# Altium schematic symbol library jlcpcb_2025_04_resistors_extended_1210.schlib: 2670 symbols (part 14 of 14)
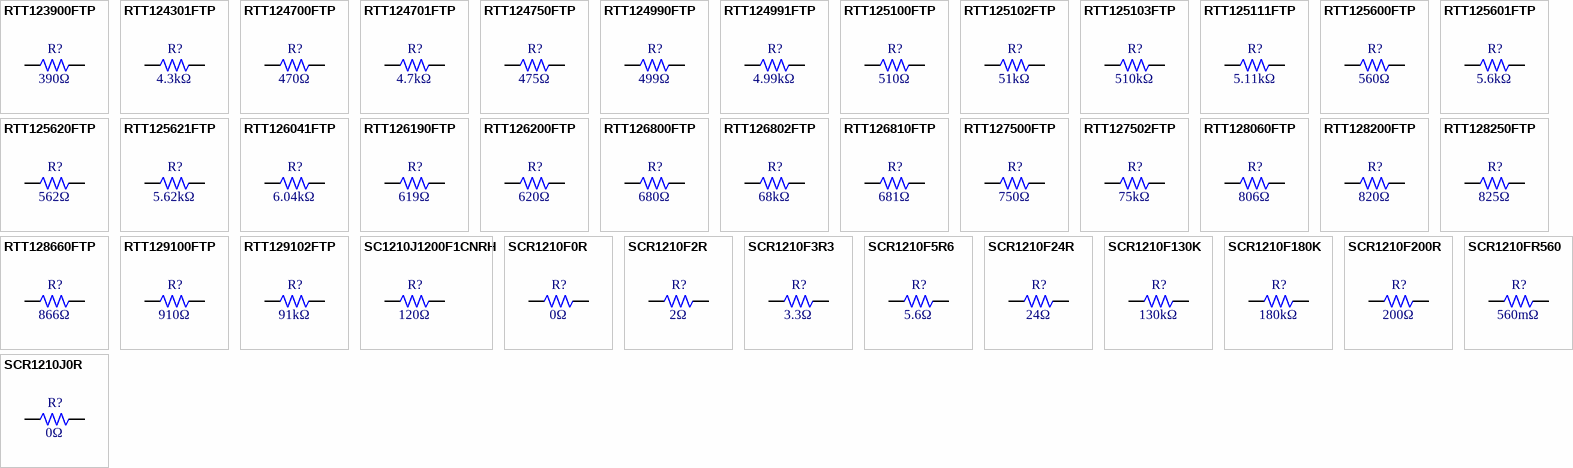
[diagram p79: symbols RTT123900FTP to SCR1210J0R]

## RTT128200FTP
designator R?  Resistance: 820Ω  (hidden comment: *)
Resistor, 820Ω, ±1%, 500mW, 200V, ±100ppm/℃, -55℃~+155℃, SMD 1210; Manufacturer: Uniroyal; Manufacturer Part Number: RTT128200FTP; Supplier 1: LCSC; Supplier Part Number 1: C333231; JLCPCB Part Number: C333231; Power Rating: 500mW; Category: Resistors; Package Size: 1210; JLCPCB Basic Part: Yes; Tolerance: ±1%; Voltage Rating: 200V; Temperature Coefficient: ±100ppm/℃; Temperature Rating: -55℃~+155℃; ComponentLink1Description: Datasheet; ComponentLink1URL: https://wmsc.lcsc.com/wmsc/upload/file/pdf/v2/lcsc/2304140030_RALEC-RTT128200FTP_C333231.pdf; ComponentLink2Description: JLCPCB Part URL; ComponentLink2URL: https://jlcpcb.com/partdetail/C333231
pins: 1, 2
1 alternate drawing of the same symbol

## RTT128250FTP
designator R?  Resistance: 825Ω  (hidden comment: *)
Resistor, 825Ω, ±1%, 500mW, 200V, ±100ppm/℃, -55℃~+155℃, SMD 1210; Manufacturer: Uniroyal; Manufacturer Part Number: RTT128250FTP; Supplier 1: LCSC; Supplier Part Number 1: C333233; JLCPCB Part Number: C333233; Power Rating: 500mW; Category: Resistors; Package Size: 1210; JLCPCB Basic Part: Yes; Tolerance: ±1%; Voltage Rating: 200V; Temperature Coefficient: ±100ppm/℃; Temperature Rating: -55℃~+155℃; ComponentLink1Description: Datasheet; ComponentLink1URL: https://wmsc.lcsc.com/wmsc/upload/file/pdf/v2/lcsc/2304140030_RALEC-RTT128250FTP_C333233.pdf; ComponentLink2Description: JLCPCB Part URL; ComponentLink2URL: https://jlcpcb.com/partdetail/C333233
pins: 1, 2
1 alternate drawing of the same symbol

## RTT128660FTP
designator R?  Resistance: 866Ω  (hidden comment: *)
Resistor, 866Ω, ±1%, 500mW, 200V, ±100ppm/℃, -55℃~+155℃, SMD 1210; Manufacturer: Uniroyal; Manufacturer Part Number: RTT128660FTP; Supplier 1: LCSC; Supplier Part Number 1: C333235; JLCPCB Part Number: C333235; Power Rating: 500mW; Category: Resistors; Package Size: 1210; JLCPCB Basic Part: Yes; Tolerance: ±1%; Voltage Rating: 200V; Temperature Coefficient: ±100ppm/℃; Temperature Rating: -55℃~+155℃; ComponentLink1Description: Datasheet; ComponentLink1URL: https://wmsc.lcsc.com/wmsc/upload/file/pdf/v2/lcsc/2304140030_RALEC-RTT128660FTP_C333235.pdf; ComponentLink2Description: JLCPCB Part URL; ComponentLink2URL: https://jlcpcb.com/partdetail/C333235
pins: 1, 2
1 alternate drawing of the same symbol

## RTT129100FTP
designator R?  Resistance: 910Ω  (hidden comment: *)
Resistor, 910Ω, ±1%, 500mW, 200V, ±100ppm/℃, -55℃~+155℃, SMD 1210; Manufacturer: Uniroyal; Manufacturer Part Number: RTT129100FTP; Supplier 1: LCSC; Supplier Part Number 1: C333238; JLCPCB Part Number: C333238; Power Rating: 500mW; Category: Resistors; Package Size: 1210; JLCPCB Basic Part: Yes; Tolerance: ±1%; Voltage Rating: 200V; Temperature Coefficient: ±100ppm/℃; Temperature Rating: -55℃~+155℃; ComponentLink1Description: Datasheet; ComponentLink1URL: https://wmsc.lcsc.com/wmsc/upload/file/pdf/v2/lcsc/2304140030_RALEC-RTT129100FTP_C333238.pdf; ComponentLink2Description: JLCPCB Part URL; ComponentLink2URL: https://jlcpcb.com/partdetail/C333238
pins: 1, 2
1 alternate drawing of the same symbol

## RTT129102FTP
designator R?  Resistance: 91kΩ  (hidden comment: *)
Resistor, 91kΩ, ±1%, 500mW, 200V, ±100ppm/℃, -55℃~+155℃, SMD 1210; Manufacturer: Uniroyal; Manufacturer Part Number: RTT129102FTP; Supplier 1: LCSC; Supplier Part Number 1: C333240; JLCPCB Part Number: C333240; Power Rating: 500mW; Category: Resistors; Package Size: 1210; JLCPCB Basic Part: Yes; Tolerance: ±1%; Voltage Rating: 200V; Temperature Coefficient: ±100ppm/℃; Temperature Rating: -55℃~+155℃; ComponentLink1Description: Datasheet; ComponentLink1URL: https://wmsc.lcsc.com/wmsc/upload/file/pdf/v2/lcsc/2304140030_RALEC-RTT129102FTP_C333240.pdf; ComponentLink2Description: JLCPCB Part URL; ComponentLink2URL: https://jlcpcb.com/partdetail/C333240
pins: 1, 2
1 alternate drawing of the same symbol

## SC1210J1200F1CNRH
designator R?  Resistance: 120Ω  (hidden comment: *)
Resistor, 120Ω, ±5%, 500mW, ±100ppm/℃, SMD 1210; Manufacturer: Uniroyal; Manufacturer Part Number: SC1210J1200F1CNRH; Supplier 1: LCSC; Supplier Part Number 1: C5140564; JLCPCB Part Number: C5140564; Power Rating: 500mW; Category: Resistors; Package Size: 1210; JLCPCB Basic Part: Yes; Tolerance: ±5%; Temperature Coefficient: ±100ppm/℃; ComponentLink1Description: Datasheet; ComponentLink1URL: https://datasheet.lcsc.com/lcsc/2208161601_Sunway-SC1210J1200F1CNRH_C5140564.pdf; ComponentLink2Description: JLCPCB Part URL; ComponentLink2URL: https://jlcpcb.com/partdetail/C5140564
pins: 1, 2
1 alternate drawing of the same symbol

## SCR1210F0R
designator R?  Resistance: 0Ω  (hidden comment: *)
Resistor, 0Ω, ±1%, SMD 1210; Manufacturer: Uniroyal; Manufacturer Part Number: SCR1210F0R; Supplier 1: LCSC; Supplier Part Number 1: C3017387; JLCPCB Part Number: C3017387; Category: Resistors; Package Size: 1210; JLCPCB Basic Part: Yes; Tolerance: ±1%; ComponentLink1Description: Datasheet; ComponentLink1URL: https://wmsc.lcsc.com/wmsc/upload/file/pdf/v2/lcsc/2206021145_VO-SCR1210F0R_C3017387.pdf; ComponentLink2Description: JLCPCB Part URL; ComponentLink2URL: https://jlcpcb.com/partdetail/C3017387
pins: 1, 2
1 alternate drawing of the same symbol

## SCR1210F2R
designator R?  Resistance: 2Ω  (hidden comment: *)
Resistor, 2Ω, ±1%, 500mW, 200V, -55℃~+155℃, SMD 1210; Manufacturer: Uniroyal; Manufacturer Part Number: SCR1210F2R; Supplier 1: LCSC; Supplier Part Number 1: C3017368; JLCPCB Part Number: C3017368; Power Rating: 500mW; Category: Resistors; Package Size: 1210; JLCPCB Basic Part: Yes; Tolerance: ±1%; Voltage Rating: 200V; Temperature Rating: -55℃~+155℃; ComponentLink1Description: Datasheet; ComponentLink1URL: https://wmsc.lcsc.com/wmsc/upload/file/pdf/v2/lcsc/2206021145_VO-SCR1210F2R_C3017368.pdf; ComponentLink2Description: JLCPCB Part URL; ComponentLink2URL: https://jlcpcb.com/partdetail/C3017368
pins: 1, 2
1 alternate drawing of the same symbol

## SCR1210F3R3
designator R?  Resistance: 3.3Ω  (hidden comment: *)
Resistor, 3.3Ω, ±1%, 500mW, 200V, -55℃~+155℃, SMD 1210; Manufacturer: Uniroyal; Manufacturer Part Number: SCR1210F3R3; Supplier 1: LCSC; Supplier Part Number 1: C3017390; JLCPCB Part Number: C3017390; Power Rating: 500mW; Category: Resistors; Package Size: 1210; JLCPCB Basic Part: Yes; Tolerance: ±1%; Voltage Rating: 200V; Temperature Rating: -55℃~+155℃; ComponentLink1Description: Datasheet; ComponentLink1URL: https://wmsc.lcsc.com/wmsc/upload/file/pdf/v2/lcsc/2206021145_VO-SCR1210F3R3_C3017390.pdf; ComponentLink2Description: JLCPCB Part URL; ComponentLink2URL: https://jlcpcb.com/partdetail/C3017390
pins: 1, 2
1 alternate drawing of the same symbol

## SCR1210F5R6
designator R?  Resistance: 5.6Ω  (hidden comment: *)
Resistor, 5.6Ω, ±1%, 500mW, 200V, -55℃~+155℃, SMD 1210; Manufacturer: Uniroyal; Manufacturer Part Number: SCR1210F5R6; Supplier 1: LCSC; Supplier Part Number 1: C3017374; JLCPCB Part Number: C3017374; Power Rating: 500mW; Category: Resistors; Package Size: 1210; JLCPCB Basic Part: Yes; Tolerance: ±1%; Voltage Rating: 200V; Temperature Rating: -55℃~+155℃; ComponentLink1Description: Datasheet; ComponentLink1URL: https://wmsc.lcsc.com/wmsc/upload/file/pdf/v2/lcsc/2206021145_VO-SCR1210F5R6_C3017374.pdf; ComponentLink2Description: JLCPCB Part URL; ComponentLink2URL: https://jlcpcb.com/partdetail/C3017374
pins: 1, 2
1 alternate drawing of the same symbol

## SCR1210F24R
designator R?  Resistance: 24Ω  (hidden comment: *)
Resistor, 24Ω, ±1%, 500mW, 200V, -55℃~+155℃, SMD 1210; Manufacturer: Uniroyal; Manufacturer Part Number: SCR1210F24R; Supplier 1: LCSC; Supplier Part Number 1: C3017389; JLCPCB Part Number: C3017389; Power Rating: 500mW; Category: Resistors; Package Size: 1210; JLCPCB Basic Part: Yes; Tolerance: ±1%; Voltage Rating: 200V; Temperature Rating: -55℃~+155℃; ComponentLink1Description: Datasheet; ComponentLink1URL: https://wmsc.lcsc.com/wmsc/upload/file/pdf/v2/lcsc/2206021145_VO-SCR1210F24R_C3017389.pdf; ComponentLink2Description: JLCPCB Part URL; ComponentLink2URL: https://jlcpcb.com/partdetail/C3017389
pins: 1, 2
1 alternate drawing of the same symbol

## SCR1210F130K
designator R?  Resistance: 130kΩ  (hidden comment: *)
Resistor, 130kΩ, ±1%, 500mW, 200V, -55℃~+155℃, SMD 1210; Manufacturer: Uniroyal; Manufacturer Part Number: SCR1210F130K; Supplier 1: LCSC; Supplier Part Number 1: C3017388; JLCPCB Part Number: C3017388; Power Rating: 500mW; Category: Resistors; Package Size: 1210; JLCPCB Basic Part: Yes; Tolerance: ±1%; Voltage Rating: 200V; Temperature Rating: -55℃~+155℃; ComponentLink1Description: Datasheet; ComponentLink1URL: https://wmsc.lcsc.com/wmsc/upload/file/pdf/v2/lcsc/2206021145_VO-SCR1210F130K_C3017388.pdf; ComponentLink2Description: JLCPCB Part URL; ComponentLink2URL: https://jlcpcb.com/partdetail/C3017388
pins: 1, 2
1 alternate drawing of the same symbol

## SCR1210F180K
designator R?  Resistance: 180kΩ  (hidden comment: *)
Resistor, 180kΩ, ±1%, SMD 1210; Manufacturer: Uniroyal; Manufacturer Part Number: SCR1210F180K; Supplier 1: LCSC; Supplier Part Number 1: C3017371; JLCPCB Part Number: C3017371; Category: Resistors; Package Size: 1210; JLCPCB Basic Part: Yes; Tolerance: ±1%; ComponentLink1Description: Datasheet; ComponentLink1URL: https://wmsc.lcsc.com/wmsc/upload/file/pdf/v2/lcsc/2206021145_VO-SCR1210F180K_C3017371.pdf; ComponentLink2Description: JLCPCB Part URL; ComponentLink2URL: https://jlcpcb.com/partdetail/C3017371
pins: 1, 2
1 alternate drawing of the same symbol

## SCR1210F200R
designator R?  Resistance: 200Ω  (hidden comment: *)
Resistor, 200Ω, ±1%, 500mW, 200V, -55℃~+155℃, SMD 1210; Manufacturer: Uniroyal; Manufacturer Part Number: SCR1210F200R; Supplier 1: LCSC; Supplier Part Number 1: C3017366; JLCPCB Part Number: C3017366; Power Rating: 500mW; Category: Resistors; Package Size: 1210; JLCPCB Basic Part: Yes; Tolerance: ±1%; Voltage Rating: 200V; Temperature Rating: -55℃~+155℃; ComponentLink1Description: Datasheet; ComponentLink1URL: https://wmsc.lcsc.com/wmsc/upload/file/pdf/v2/lcsc/2206021145_VO-SCR1210F200R_C3017366.pdf; ComponentLink2Description: JLCPCB Part URL; ComponentLink2URL: https://jlcpcb.com/partdetail/C3017366
pins: 1, 2
1 alternate drawing of the same symbol

## SCR1210FR560
designator R?  Resistance: 560mΩ  (hidden comment: *)
Resistor, 560mΩ, ±1%, 500mW, 200V, -55℃~+155℃, SMD 1210; Manufacturer: Uniroyal; Manufacturer Part Number: SCR1210FR560; Supplier 1: LCSC; Supplier Part Number 1: C3017384; JLCPCB Part Number: C3017384; Power Rating: 500mW; Category: Resistors; Package Size: 1210; JLCPCB Basic Part: Yes; Tolerance: ±1%; Voltage Rating: 200V; Temperature Rating: -55℃~+155℃; ComponentLink1Description: Datasheet; ComponentLink1URL: https://wmsc.lcsc.com/wmsc/upload/file/pdf/v2/lcsc/2206021145_VO-SCR1210FR560_C3017384.pdf; ComponentLink2Description: JLCPCB Part URL; ComponentLink2URL: https://jlcpcb.com/partdetail/C3017384
pins: 1, 2
1 alternate drawing of the same symbol

## SCR1210J0R
designator R?  Resistance: 0Ω  (hidden comment: *)
Resistor, 0Ω, ±5%, SMD 1210; Manufacturer: Uniroyal; Manufacturer Part Number: SCR1210J0R; Supplier 1: LCSC; Supplier Part Number 1: C3018186; JLCPCB Part Number: C3018186; Category: Resistors; Package Size: 1210; JLCPCB Basic Part: Yes; Tolerance: ±5%; ComponentLink1Description: Datasheet; ComponentLink1URL: https://wmsc.lcsc.com/wmsc/upload/file/pdf/v2/lcsc/2205131745_VO-SCR1210J0R_C3018186.pdf; ComponentLink2Description: JLCPCB Part URL; ComponentLink2URL: https://jlcpcb.com/partdetail/C3018186
pins: 1, 2
1 alternate drawing of the same symbol

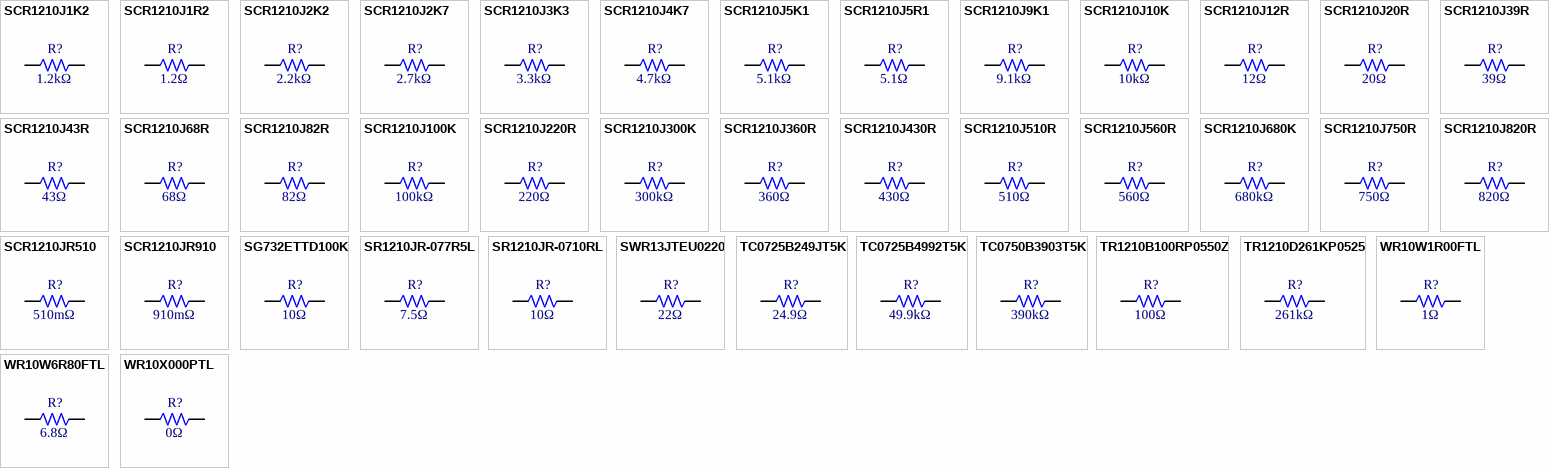
[diagram p64: symbols SCR1210J1K2 to WR10X000PTL]

## SCR1210J1K2
designator R?  Resistance: 1.2kΩ  (hidden comment: *)
Resistor, 1.2kΩ, ±5%, 500mW, 200V, -55℃~+155℃, SMD 1210; Manufacturer: Uniroyal; Manufacturer Part Number: SCR1210J1K2; Supplier 1: LCSC; Supplier Part Number 1: C3018173; JLCPCB Part Number: C3018173; Power Rating: 500mW; Category: Resistors; Package Size: 1210; JLCPCB Basic Part: Yes; Tolerance: ±5%; Voltage Rating: 200V; Temperature Rating: -55℃~+155℃; ComponentLink1Description: Datasheet; ComponentLink1URL: https://wmsc.lcsc.com/wmsc/upload/file/pdf/v2/lcsc/2205131745_VO-SCR1210J1K2_C3018173.pdf; ComponentLink2Description: JLCPCB Part URL; ComponentLink2URL: https://jlcpcb.com/partdetail/C3018173
pins: 1, 2
1 alternate drawing of the same symbol

## SCR1210J1R2
designator R?  Resistance: 1.2Ω  (hidden comment: *)
Resistor, 1.2Ω, ±5%, 500mW, 200V, -55℃~+155℃, SMD 1210; Manufacturer: Uniroyal; Manufacturer Part Number: SCR1210J1R2; Supplier 1: LCSC; Supplier Part Number 1: C3018121; JLCPCB Part Number: C3018121; Power Rating: 500mW; Category: Resistors; Package Size: 1210; JLCPCB Basic Part: Yes; Tolerance: ±5%; Voltage Rating: 200V; Temperature Rating: -55℃~+155℃; ComponentLink1Description: Datasheet; ComponentLink1URL: https://wmsc.lcsc.com/wmsc/upload/file/pdf/v2/lcsc/2205131745_VO-SCR1210J1R2_C3018121.pdf; ComponentLink2Description: JLCPCB Part URL; ComponentLink2URL: https://jlcpcb.com/partdetail/C3018121
pins: 1, 2
1 alternate drawing of the same symbol

## SCR1210J2K2
designator R?  Resistance: 2.2kΩ  (hidden comment: *)
Resistor, 2.2kΩ, ±5%, 500mW, 200V, -55℃~+155℃, SMD 1210; Manufacturer: Uniroyal; Manufacturer Part Number: SCR1210J2K2; Supplier 1: LCSC; Supplier Part Number 1: C3018125; JLCPCB Part Number: C3018125; Power Rating: 500mW; Category: Resistors; Package Size: 1210; JLCPCB Basic Part: Yes; Tolerance: ±5%; Voltage Rating: 200V; Temperature Rating: -55℃~+155℃; ComponentLink1Description: Datasheet; ComponentLink1URL: https://wmsc.lcsc.com/wmsc/upload/file/pdf/v2/lcsc/2205131745_VO-SCR1210J2K2_C3018125.pdf; ComponentLink2Description: JLCPCB Part URL; ComponentLink2URL: https://jlcpcb.com/partdetail/C3018125
pins: 1, 2
1 alternate drawing of the same symbol

## SCR1210J2K7
designator R?  Resistance: 2.7kΩ  (hidden comment: *)
Resistor, 2.7kΩ, ±5%, 500mW, 200V, -55℃~+155℃, SMD 1210; Manufacturer: Uniroyal; Manufacturer Part Number: SCR1210J2K7; Supplier 1: LCSC; Supplier Part Number 1: C3018174; JLCPCB Part Number: C3018174; Power Rating: 500mW; Category: Resistors; Package Size: 1210; JLCPCB Basic Part: Yes; Tolerance: ±5%; Voltage Rating: 200V; Temperature Rating: -55℃~+155℃; ComponentLink1Description: Datasheet; ComponentLink1URL: https://wmsc.lcsc.com/wmsc/upload/file/pdf/v2/lcsc/2205131745_VO-SCR1210J2K7_C3018174.pdf; ComponentLink2Description: JLCPCB Part URL; ComponentLink2URL: https://jlcpcb.com/partdetail/C3018174
pins: 1, 2
1 alternate drawing of the same symbol

## SCR1210J3K3
designator R?  Resistance: 3.3kΩ  (hidden comment: *)
Resistor, 3.3kΩ, ±5%, 500mW, 200V, -55℃~+155℃, SMD 1210; Manufacturer: Uniroyal; Manufacturer Part Number: SCR1210J3K3; Supplier 1: LCSC; Supplier Part Number 1: C3018230; JLCPCB Part Number: C3018230; Power Rating: 500mW; Category: Resistors; Package Size: 1210; JLCPCB Basic Part: Yes; Tolerance: ±5%; Voltage Rating: 200V; Temperature Rating: -55℃~+155℃; ComponentLink1Description: Datasheet; ComponentLink1URL: https://wmsc.lcsc.com/wmsc/upload/file/pdf/v2/lcsc/2205131745_VO-SCR1210J3K3_C3018230.pdf; ComponentLink2Description: JLCPCB Part URL; ComponentLink2URL: https://jlcpcb.com/partdetail/C3018230
pins: 1, 2
1 alternate drawing of the same symbol

## SCR1210J4K7
designator R?  Resistance: 4.7kΩ  (hidden comment: *)
Resistor, 4.7kΩ, ±5%, 500mW, 200V, -55℃~+155℃, SMD 1210; Manufacturer: Uniroyal; Manufacturer Part Number: SCR1210J4K7; Supplier 1: LCSC; Supplier Part Number 1: C3018206; JLCPCB Part Number: C3018206; Power Rating: 500mW; Category: Resistors; Package Size: 1210; JLCPCB Basic Part: Yes; Tolerance: ±5%; Voltage Rating: 200V; Temperature Rating: -55℃~+155℃; ComponentLink1Description: Datasheet; ComponentLink1URL: https://wmsc.lcsc.com/wmsc/upload/file/pdf/v2/lcsc/2205131745_VO-SCR1210J4K7_C3018206.pdf; ComponentLink2Description: JLCPCB Part URL; ComponentLink2URL: https://jlcpcb.com/partdetail/C3018206
pins: 1, 2
1 alternate drawing of the same symbol

## SCR1210J5K1
designator R?  Resistance: 5.1kΩ  (hidden comment: *)
Resistor, 5.1kΩ, ±5%, 500mW, 200V, -55℃~+155℃, SMD 1210; Manufacturer: Uniroyal; Manufacturer Part Number: SCR1210J5K1; Supplier 1: LCSC; Supplier Part Number 1: C3018207; JLCPCB Part Number: C3018207; Power Rating: 500mW; Category: Resistors; Package Size: 1210; JLCPCB Basic Part: Yes; Tolerance: ±5%; Voltage Rating: 200V; Temperature Rating: -55℃~+155℃; ComponentLink1Description: Datasheet; ComponentLink1URL: https://wmsc.lcsc.com/wmsc/upload/file/pdf/v2/lcsc/2205131745_VO-SCR1210J5K1_C3018207.pdf; ComponentLink2Description: JLCPCB Part URL; ComponentLink2URL: https://jlcpcb.com/partdetail/C3018207
pins: 1, 2
1 alternate drawing of the same symbol

## SCR1210J5R1
designator R?  Resistance: 5.1Ω  (hidden comment: *)
Resistor, 5.1Ω, ±5%, 500mW, 200V, -55℃~+155℃, SMD 1210; Manufacturer: Uniroyal; Manufacturer Part Number: SCR1210J5R1; Supplier 1: LCSC; Supplier Part Number 1: C3018141; JLCPCB Part Number: C3018141; Power Rating: 500mW; Category: Resistors; Package Size: 1210; JLCPCB Basic Part: Yes; Tolerance: ±5%; Voltage Rating: 200V; Temperature Rating: -55℃~+155℃; ComponentLink1Description: Datasheet; ComponentLink1URL: https://wmsc.lcsc.com/wmsc/upload/file/pdf/v2/lcsc/2205131745_VO-SCR1210J5R1_C3018141.pdf; ComponentLink2Description: JLCPCB Part URL; ComponentLink2URL: https://jlcpcb.com/partdetail/C3018141
pins: 1, 2
1 alternate drawing of the same symbol

## SCR1210J9K1
designator R?  Resistance: 9.1kΩ  (hidden comment: *)
Resistor, 9.1kΩ, ±5%, 500mW, 200V, -55℃~+155℃, SMD 1210; Manufacturer: Uniroyal; Manufacturer Part Number: SCR1210J9K1; Supplier 1: LCSC; Supplier Part Number 1: C3018136; JLCPCB Part Number: C3018136; Power Rating: 500mW; Category: Resistors; Package Size: 1210; JLCPCB Basic Part: Yes; Tolerance: ±5%; Voltage Rating: 200V; Temperature Rating: -55℃~+155℃; ComponentLink1Description: Datasheet; ComponentLink1URL: https://wmsc.lcsc.com/wmsc/upload/file/pdf/v2/lcsc/2205131745_VO-SCR1210J9K1_C3018136.pdf; ComponentLink2Description: JLCPCB Part URL; ComponentLink2URL: https://jlcpcb.com/partdetail/C3018136
pins: 1, 2
1 alternate drawing of the same symbol

## SCR1210J10K
designator R?  Resistance: 10kΩ  (hidden comment: *)
Resistor, 10kΩ, ±5%, SMD 1210; Manufacturer: Uniroyal; Manufacturer Part Number: SCR1210J10K; Supplier 1: LCSC; Supplier Part Number 1: C3018181; JLCPCB Part Number: C3018181; Category: Resistors; Package Size: 1210; JLCPCB Basic Part: Yes; Tolerance: ±5%; ComponentLink1Description: Datasheet; ComponentLink1URL: https://wmsc.lcsc.com/wmsc/upload/file/pdf/v2/lcsc/2205131745_VO-SCR1210J10K_C3018181.pdf; ComponentLink2Description: JLCPCB Part URL; ComponentLink2URL: https://jlcpcb.com/partdetail/C3018181
pins: 1, 2
1 alternate drawing of the same symbol

## SCR1210J12R
designator R?  Resistance: 12Ω  (hidden comment: *)
Resistor, 12Ω, ±5%, 500mW, 200V, -55℃~+155℃, SMD 1210; Manufacturer: Uniroyal; Manufacturer Part Number: SCR1210J12R; Supplier 1: LCSC; Supplier Part Number 1: C3018164; JLCPCB Part Number: C3018164; Power Rating: 500mW; Category: Resistors; Package Size: 1210; JLCPCB Basic Part: Yes; Tolerance: ±5%; Voltage Rating: 200V; Temperature Rating: -55℃~+155℃; ComponentLink1Description: Datasheet; ComponentLink1URL: https://wmsc.lcsc.com/wmsc/upload/file/pdf/v2/lcsc/2205131745_VO-SCR1210J12R_C3018164.pdf; ComponentLink2Description: JLCPCB Part URL; ComponentLink2URL: https://jlcpcb.com/partdetail/C3018164
pins: 1, 2
1 alternate drawing of the same symbol

## SCR1210J20R
designator R?  Resistance: 20Ω  (hidden comment: *)
Resistor, 20Ω, ±5%, 500mW, 200V, -55℃~+155℃, SMD 1210; Manufacturer: Uniroyal; Manufacturer Part Number: SCR1210J20R; Supplier 1: LCSC; Supplier Part Number 1: C3018195; JLCPCB Part Number: C3018195; Power Rating: 500mW; Category: Resistors; Package Size: 1210; JLCPCB Basic Part: Yes; Tolerance: ±5%; Voltage Rating: 200V; Temperature Rating: -55℃~+155℃; ComponentLink1Description: Datasheet; ComponentLink1URL: https://wmsc.lcsc.com/wmsc/upload/file/pdf/v2/lcsc/2205131745_VO-SCR1210J20R_C3018195.pdf; ComponentLink2Description: JLCPCB Part URL; ComponentLink2URL: https://jlcpcb.com/partdetail/C3018195
pins: 1, 2
1 alternate drawing of the same symbol

## SCR1210J39R
designator R?  Resistance: 39Ω  (hidden comment: *)
Resistor, 39Ω, ±5%, 500mW, 200V, -55℃~+155℃, SMD 1210; Manufacturer: Uniroyal; Manufacturer Part Number: SCR1210J39R; Supplier 1: LCSC; Supplier Part Number 1: C3018182; JLCPCB Part Number: C3018182; Power Rating: 500mW; Category: Resistors; Package Size: 1210; JLCPCB Basic Part: Yes; Tolerance: ±5%; Voltage Rating: 200V; Temperature Rating: -55℃~+155℃; ComponentLink1Description: Datasheet; ComponentLink1URL: https://wmsc.lcsc.com/wmsc/upload/file/pdf/v2/lcsc/2205131745_VO-SCR1210J39R_C3018182.pdf; ComponentLink2Description: JLCPCB Part URL; ComponentLink2URL: https://jlcpcb.com/partdetail/C3018182
pins: 1, 2
1 alternate drawing of the same symbol

## SCR1210J43R
designator R?  Resistance: 43Ω  (hidden comment: *)
Resistor, 43Ω, ±5%, 500mW, 200V, -55℃~+155℃, SMD 1210; Manufacturer: Uniroyal; Manufacturer Part Number: SCR1210J43R; Supplier 1: LCSC; Supplier Part Number 1: C3018162; JLCPCB Part Number: C3018162; Power Rating: 500mW; Category: Resistors; Package Size: 1210; JLCPCB Basic Part: Yes; Tolerance: ±5%; Voltage Rating: 200V; Temperature Rating: -55℃~+155℃; ComponentLink1Description: Datasheet; ComponentLink1URL: https://wmsc.lcsc.com/wmsc/upload/file/pdf/v2/lcsc/2205131745_VO-SCR1210J43R_C3018162.pdf; ComponentLink2Description: JLCPCB Part URL; ComponentLink2URL: https://jlcpcb.com/partdetail/C3018162
pins: 1, 2
1 alternate drawing of the same symbol

## SCR1210J68R
designator R?  Resistance: 68Ω  (hidden comment: *)
Resistor, 68Ω, ±5%, 500mW, 200V, -55℃~+155℃, SMD 1210; Manufacturer: Uniroyal; Manufacturer Part Number: SCR1210J68R; Supplier 1: LCSC; Supplier Part Number 1: C3018224; JLCPCB Part Number: C3018224; Power Rating: 500mW; Category: Resistors; Package Size: 1210; JLCPCB Basic Part: Yes; Tolerance: ±5%; Voltage Rating: 200V; Temperature Rating: -55℃~+155℃; ComponentLink1Description: Datasheet; ComponentLink1URL: https://wmsc.lcsc.com/wmsc/upload/file/pdf/v2/lcsc/2205131745_VO-SCR1210J68R_C3018224.pdf; ComponentLink2Description: JLCPCB Part URL; ComponentLink2URL: https://jlcpcb.com/partdetail/C3018224
pins: 1, 2
1 alternate drawing of the same symbol

## SCR1210J82R
designator R?  Resistance: 82Ω  (hidden comment: *)
Resistor, 82Ω, ±5%, 500mW, 200V, -55℃~+155℃, SMD 1210; Manufacturer: Uniroyal; Manufacturer Part Number: SCR1210J82R; Supplier 1: LCSC; Supplier Part Number 1: C3018155; JLCPCB Part Number: C3018155; Power Rating: 500mW; Category: Resistors; Package Size: 1210; JLCPCB Basic Part: Yes; Tolerance: ±5%; Voltage Rating: 200V; Temperature Rating: -55℃~+155℃; ComponentLink1Description: Datasheet; ComponentLink1URL: https://wmsc.lcsc.com/wmsc/upload/file/pdf/v2/lcsc/2205131745_VO-SCR1210J82R_C3018155.pdf; ComponentLink2Description: JLCPCB Part URL; ComponentLink2URL: https://jlcpcb.com/partdetail/C3018155
pins: 1, 2
1 alternate drawing of the same symbol

## SCR1210J100K
designator R?  Resistance: 100kΩ  (hidden comment: *)
Resistor, 100kΩ, ±5%, 500mW, 200V, -55℃~+155℃, SMD 1210; Manufacturer: Uniroyal; Manufacturer Part Number: SCR1210J100K; Supplier 1: LCSC; Supplier Part Number 1: C3018161; JLCPCB Part Number: C3018161; Power Rating: 500mW; Category: Resistors; Package Size: 1210; JLCPCB Basic Part: Yes; Tolerance: ±5%; Voltage Rating: 200V; Temperature Rating: -55℃~+155℃; ComponentLink1Description: Datasheet; ComponentLink1URL: https://wmsc.lcsc.com/wmsc/upload/file/pdf/v2/lcsc/2205131745_VO-SCR1210J100K_C3018161.pdf; ComponentLink2Description: JLCPCB Part URL; ComponentLink2URL: https://jlcpcb.com/partdetail/C3018161
pins: 1, 2
1 alternate drawing of the same symbol

## SCR1210J220R
designator R?  Resistance: 220Ω  (hidden comment: *)
Resistor, 220Ω, ±5%, 500mW, 200V, -55℃~+155℃, SMD 1210; Manufacturer: Uniroyal; Manufacturer Part Number: SCR1210J220R; Supplier 1: LCSC; Supplier Part Number 1: C3018232; JLCPCB Part Number: C3018232; Power Rating: 500mW; Category: Resistors; Package Size: 1210; JLCPCB Basic Part: Yes; Tolerance: ±5%; Voltage Rating: 200V; Temperature Rating: -55℃~+155℃; ComponentLink1Description: Datasheet; ComponentLink1URL: https://wmsc.lcsc.com/wmsc/upload/file/pdf/v2/lcsc/2205131745_VO-SCR1210J220R_C3018232.pdf; ComponentLink2Description: JLCPCB Part URL; ComponentLink2URL: https://jlcpcb.com/partdetail/C3018232
pins: 1, 2
1 alternate drawing of the same symbol

## SCR1210J300K
designator R?  Resistance: 300kΩ  (hidden comment: *)
Resistor, 300kΩ, ±5%, 500mW, 200V, -55℃~+155℃, SMD 1210; Manufacturer: Uniroyal; Manufacturer Part Number: SCR1210J300K; Supplier 1: LCSC; Supplier Part Number 1: C3018145; JLCPCB Part Number: C3018145; Power Rating: 500mW; Category: Resistors; Package Size: 1210; JLCPCB Basic Part: Yes; Tolerance: ±5%; Voltage Rating: 200V; Temperature Rating: -55℃~+155℃; ComponentLink1Description: Datasheet; ComponentLink1URL: https://wmsc.lcsc.com/wmsc/upload/file/pdf/v2/lcsc/2205131745_VO-SCR1210J300K_C3018145.pdf; ComponentLink2Description: JLCPCB Part URL; ComponentLink2URL: https://jlcpcb.com/partdetail/C3018145
pins: 1, 2
1 alternate drawing of the same symbol

## SCR1210J360R
designator R?  Resistance: 360Ω  (hidden comment: *)
Resistor, 360Ω, ±5%, 500mW, 200V, -55℃~+155℃, SMD 1210; Manufacturer: Uniroyal; Manufacturer Part Number: SCR1210J360R; Supplier 1: LCSC; Supplier Part Number 1: C3018135; JLCPCB Part Number: C3018135; Power Rating: 500mW; Category: Resistors; Package Size: 1210; JLCPCB Basic Part: Yes; Tolerance: ±5%; Voltage Rating: 200V; Temperature Rating: -55℃~+155℃; ComponentLink1Description: Datasheet; ComponentLink1URL: https://wmsc.lcsc.com/wmsc/upload/file/pdf/v2/lcsc/2205131745_VO-SCR1210J360R_C3018135.pdf; ComponentLink2Description: JLCPCB Part URL; ComponentLink2URL: https://jlcpcb.com/partdetail/C3018135
pins: 1, 2
1 alternate drawing of the same symbol

## SCR1210J430R
designator R?  Resistance: 430Ω  (hidden comment: *)
Resistor, 430Ω, ±5%, 500mW, 200V, -55℃~+155℃, SMD 1210; Manufacturer: Uniroyal; Manufacturer Part Number: SCR1210J430R; Supplier 1: LCSC; Supplier Part Number 1: C3018196; JLCPCB Part Number: C3018196; Power Rating: 500mW; Category: Resistors; Package Size: 1210; JLCPCB Basic Part: Yes; Tolerance: ±5%; Voltage Rating: 200V; Temperature Rating: -55℃~+155℃; ComponentLink1Description: Datasheet; ComponentLink1URL: https://wmsc.lcsc.com/wmsc/upload/file/pdf/v2/lcsc/2205131745_VO-SCR1210J430R_C3018196.pdf; ComponentLink2Description: JLCPCB Part URL; ComponentLink2URL: https://jlcpcb.com/partdetail/C3018196
pins: 1, 2
1 alternate drawing of the same symbol

## SCR1210J510R
designator R?  Resistance: 510Ω  (hidden comment: *)
Resistor, 510Ω, ±5%, 500mW, 200V, -55℃~+155℃, SMD 1210; Manufacturer: Uniroyal; Manufacturer Part Number: SCR1210J510R; Supplier 1: LCSC; Supplier Part Number 1: C3018231; JLCPCB Part Number: C3018231; Power Rating: 500mW; Category: Resistors; Package Size: 1210; JLCPCB Basic Part: Yes; Tolerance: ±5%; Voltage Rating: 200V; Temperature Rating: -55℃~+155℃; ComponentLink1Description: Datasheet; ComponentLink1URL: https://wmsc.lcsc.com/wmsc/upload/file/pdf/v2/lcsc/2205131745_VO-SCR1210J510R_C3018231.pdf; ComponentLink2Description: JLCPCB Part URL; ComponentLink2URL: https://jlcpcb.com/partdetail/C3018231
pins: 1, 2
1 alternate drawing of the same symbol

## SCR1210J560R
designator R?  Resistance: 560Ω  (hidden comment: *)
Resistor, 560Ω, ±5%, 500mW, 200V, -55℃~+155℃, SMD 1210; Manufacturer: Uniroyal; Manufacturer Part Number: SCR1210J560R; Supplier 1: LCSC; Supplier Part Number 1: C3018175; JLCPCB Part Number: C3018175; Power Rating: 500mW; Category: Resistors; Package Size: 1210; JLCPCB Basic Part: Yes; Tolerance: ±5%; Voltage Rating: 200V; Temperature Rating: -55℃~+155℃; ComponentLink1Description: Datasheet; ComponentLink1URL: https://wmsc.lcsc.com/wmsc/upload/file/pdf/v2/lcsc/2205131745_VO-SCR1210J560R_C3018175.pdf; ComponentLink2Description: JLCPCB Part URL; ComponentLink2URL: https://jlcpcb.com/partdetail/C3018175
pins: 1, 2
1 alternate drawing of the same symbol

## SCR1210J680K
designator R?  Resistance: 680kΩ  (hidden comment: *)
Resistor, 680kΩ, ±5%, 500mW, 200V, -55℃~+155℃, SMD 1210; Manufacturer: Uniroyal; Manufacturer Part Number: SCR1210J680K; Supplier 1: LCSC; Supplier Part Number 1: C3018134; JLCPCB Part Number: C3018134; Power Rating: 500mW; Category: Resistors; Package Size: 1210; JLCPCB Basic Part: Yes; Tolerance: ±5%; Voltage Rating: 200V; Temperature Rating: -55℃~+155℃; ComponentLink1Description: Datasheet; ComponentLink1URL: https://wmsc.lcsc.com/wmsc/upload/file/pdf/v2/lcsc/2205131745_VO-SCR1210J680K_C3018134.pdf; ComponentLink2Description: JLCPCB Part URL; ComponentLink2URL: https://jlcpcb.com/partdetail/C3018134
pins: 1, 2
1 alternate drawing of the same symbol

## SCR1210J750R
designator R?  Resistance: 750Ω  (hidden comment: *)
Resistor, 750Ω, ±5%, 500mW, 200V, -55℃~+155℃, SMD 1210; Manufacturer: Uniroyal; Manufacturer Part Number: SCR1210J750R; Supplier 1: LCSC; Supplier Part Number 1: C3018131; JLCPCB Part Number: C3018131; Power Rating: 500mW; Category: Resistors; Package Size: 1210; JLCPCB Basic Part: Yes; Tolerance: ±5%; Voltage Rating: 200V; Temperature Rating: -55℃~+155℃; ComponentLink1Description: Datasheet; ComponentLink1URL: https://wmsc.lcsc.com/wmsc/upload/file/pdf/v2/lcsc/2205131745_VO-SCR1210J750R_C3018131.pdf; ComponentLink2Description: JLCPCB Part URL; ComponentLink2URL: https://jlcpcb.com/partdetail/C3018131
pins: 1, 2
1 alternate drawing of the same symbol

## SCR1210J820R
designator R?  Resistance: 820Ω  (hidden comment: *)
Resistor, 820Ω, ±5%, 500mW, 200V, -55℃~+155℃, SMD 1210; Manufacturer: Uniroyal; Manufacturer Part Number: SCR1210J820R; Supplier 1: LCSC; Supplier Part Number 1: C3018168; JLCPCB Part Number: C3018168; Power Rating: 500mW; Category: Resistors; Package Size: 1210; JLCPCB Basic Part: Yes; Tolerance: ±5%; Voltage Rating: 200V; Temperature Rating: -55℃~+155℃; ComponentLink1Description: Datasheet; ComponentLink1URL: https://wmsc.lcsc.com/wmsc/upload/file/pdf/v2/lcsc/2205131745_VO-SCR1210J820R_C3018168.pdf; ComponentLink2Description: JLCPCB Part URL; ComponentLink2URL: https://jlcpcb.com/partdetail/C3018168
pins: 1, 2
1 alternate drawing of the same symbol
